# Altium footprint library mmyLibrary.PcbLib: 231 footprints (part 8 of 15)
Each footprint in its own frame and in the unit in brackets; x right, y up, seen from the top. Pads: shape width x height; smd on the part's side, far side on the other; paste and mask are expansions set on the pad; w line width, h text height; cw(c..) or ccw(c..) is an arc to the next point about the centre after c.
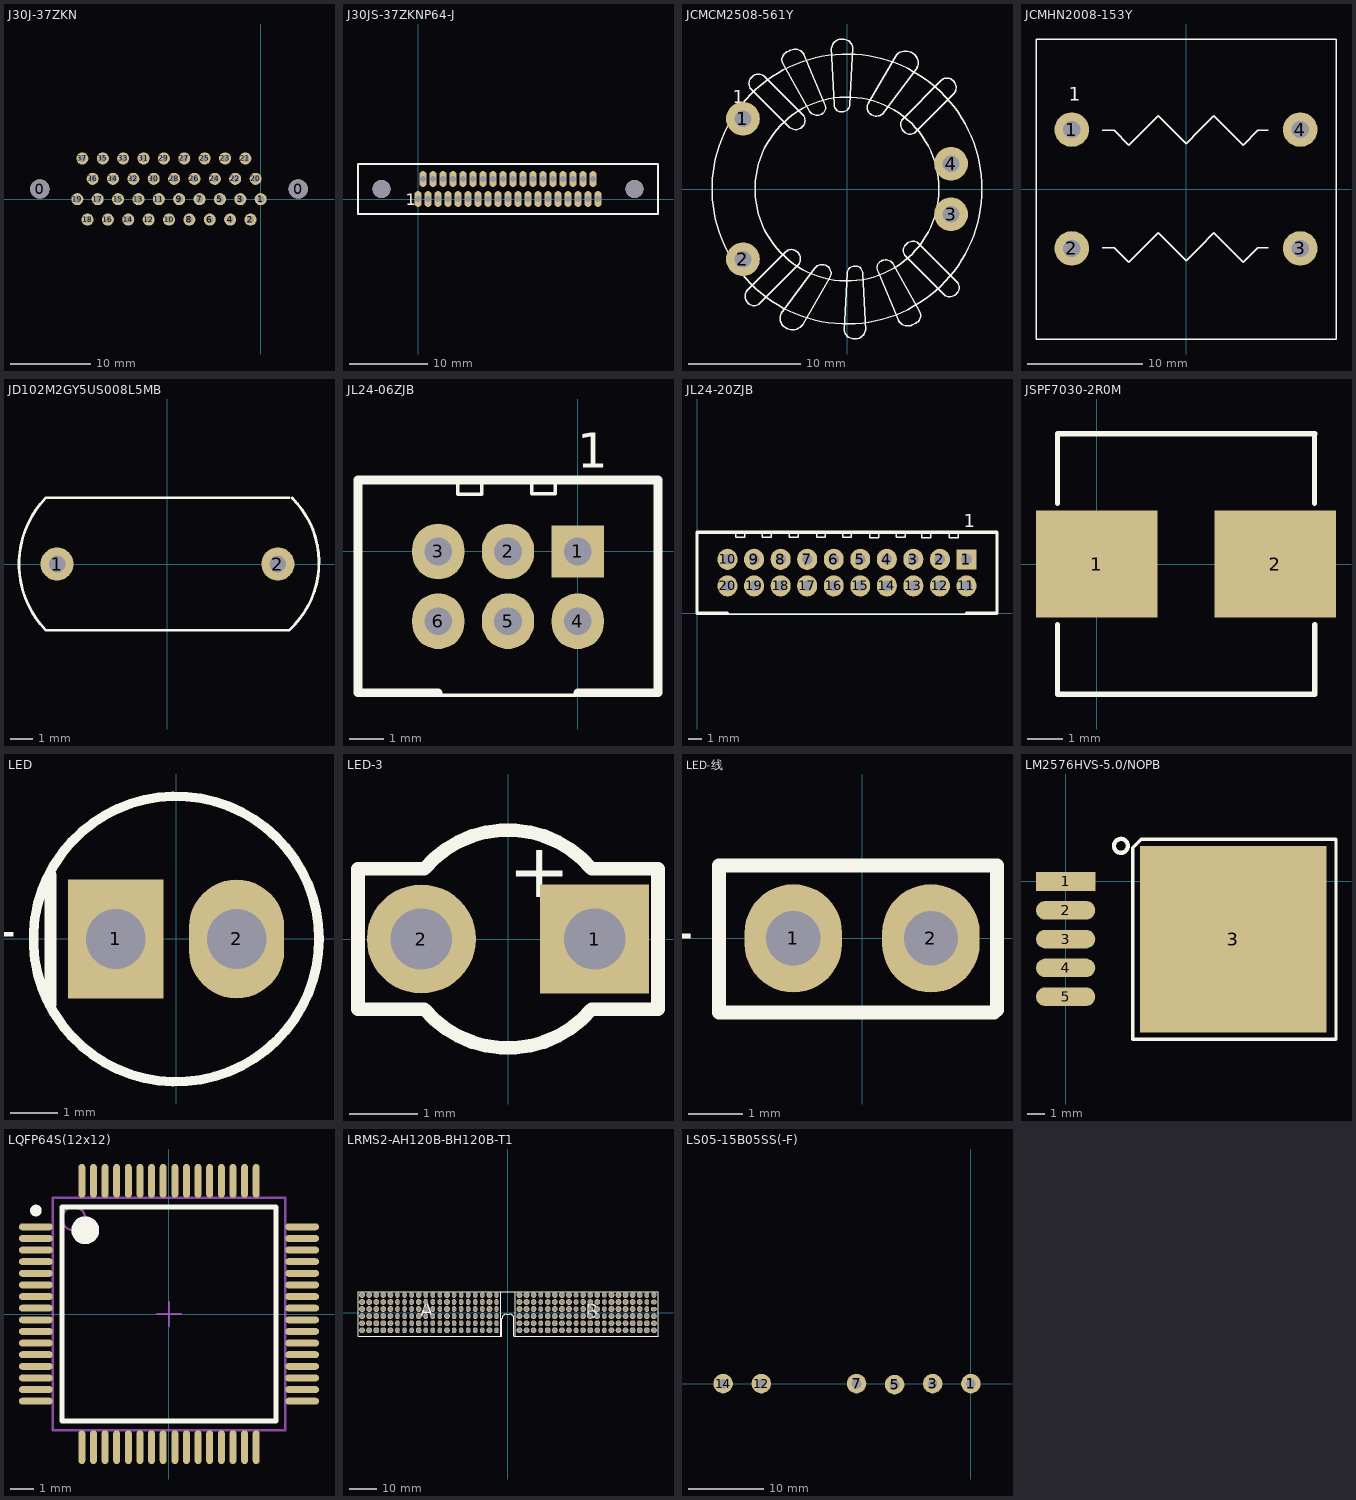
[diagram p7: the footprints below, top view; thin cyan lines are the x and y axes]

## J30J-37ZKN [mm]
pads (39):
  round 2.4 hole 2.4: 0(-27.53,1.27) 0(4.67,1.27)
  round 1.5 hole 0.9: 1(0,0) 2(-1.27,-2.54) 3(-2.54,0) 4(-3.81,-2.54) 5(-5.08,0) 6(-6.35,-2.54) 7(-7.62,0) 8(-8.89,-2.54) 9(-10.16,0) 10(-11.43,-2.54) 11(-12.7,0) 12(-13.97,-2.54) 13(-15.24,0) 14(-16.51,-2.54) 15(-17.78,0) 16(-19.05,-2.54) 17(-20.32,0) 18(-21.59,-2.54) 19(-22.86,0) 20(-0.635,2.54) 21(-1.905,5.08) 22(-3.175,2.54) 23(-4.445,5.08) 24(-5.715,2.54) 25(-6.985,5.08) 26(-8.255,2.54) 27(-9.525,5.08) 28(-10.795,2.54) 29(-12.065,5.08) 30(-13.335,2.54) 31(-14.605,5.08) 32(-15.875,2.54) 33(-17.145,5.08) 34(-18.415,2.54) 35(-19.685,5.08) 36(-20.955,2.54) 37(-22.225,5.08)
Bottom Overlay:
  lines w0.254: -30.03,1.27 cw(c-27.53,1.27) -30.03,1.224 ; 2.17,1.285 ccw(c4.67,1.27) 2.17,1.315 ; -30.13,-3.23 -30.13,5.77 7.27,5.77 7.27,-3.23 -30.13,-3.23

## J30JS-37ZKNP64-J [mm]
pads (37):
  oval 0.9x2 hole 0.7: 1(0,0) 2(1.27,0) 3(2.54,0) 4(3.81,0) 5(5.08,0) 6(6.35,0) 7(7.62,0) 8(8.89,0) 9(10.16,0) 10(11.43,0) 11(12.7,0) 12(13.97,0) 13(15.24,0) 14(16.51,0) 15(17.78,0) 16(19.05,0) 17(20.32,0) 18(21.59,0) 19(22.86,0) 20(0.635,2.54) 21(1.905,2.54) 22(3.175,2.54) 23(4.445,2.54) 24(5.715,2.54) 25(6.985,2.54) 26(8.255,2.54) 28(10.795,2.54) 29(12.065,2.54) 30(13.335,2.54) 31(14.605,2.54) 32(15.875,2.54) 33(17.145,2.54) 34(18.415,2.54) 35(19.685,2.54) 36(20.955,2.54) 37(22.225,2.54)
  oval 0.9x2 hole 0.8: 27(9.525,2.54)
via -4.635,1.27 diameter 2.3 hole 2.3
via 27.495,1.27 diameter 2.3 hole 2.3
Top Overlay:
  lines w0.254: -7.62,-1.905 -7.62,4.445 30.48,4.445 30.48,-1.905 -7.62,-1.905
  text "1" at -1.555,-0.8 h1.5

## JCMCM2508-561Y [mm]
pads (4):
  round 3 hole 1.5: 1(-9.25,6.25) 2(-9.25,-6.25) 3(9.25,-2.25) 4(9.25,2.25)
Top Overlay:
  circle w0.127: c0,0 r8.176
  circle w0.127: c0,0 r12
  lines w0.127: -8.636,9.017 -5.08,5.461 ccw(c-4.572,6.096) -3.937,5.588 ccw(c-4.445,6.096) -3.937,6.604 -7.366,10.033 ccw(c-7.874,9.398) -8.509,9.906 ccw(c-8.001,9.398) -8.509,8.89 ; -7.874,-10.287 -4.318,-6.731 ccw(c-4.953,-6.223) -4.445,-5.588 ccw(c-4.953,-6.096) -5.461,-5.588 -8.89,-9.017 ccw(c-8.255,-9.525) -8.763,-10.16 ccw(c-8.255,-9.652) -7.747,-10.16 ; -5.862,-11.034 -2.921,-7.112 cw(c-2.222,-7.556) -1.778,-6.858 cw(c-2.159,-7.493) -1.524,-7.874 -3.937,-12.065 cw(c-4.826,-11.43) -5.461,-12.319 cw(c-5.016,-11.493) -5.842,-11.049 ; -5.715,11.176 cw(c-5.016,11.493) -5.218,12.234 ; -5.704,11.182 -3.302,6.858 ccw(c-2.667,7.366) -2.159,6.731 ccw(c-2.54,7.239) -2.032,7.62 -3.847,11.976 ; -5.169,12.264 cw(c-4.635,11.493) -3.81,11.938 ; -1.397,12.446 cw(c-0.445,12.383) -0.381,13.335 cw(c-0.381,12.446) 0.508,12.446 ; -1.397,12.573 -1.143,7.493 ccw(c-0.508,7.493) -0.508,6.858 ccw(c-0.445,7.556) 0.254,7.493 0.508,12.573 ; -0.254,-12.573 0,-7.493 cw(c0.699,-7.556) 0.762,-6.858 cw(c0.762,-7.493) 1.397,-7.493 1.651,-12.573 ; -0.254,-12.446 ccw(c0.635,-12.446) 0.635,-13.335 ccw(c0.699,-12.383) 1.651,-12.446 ; 4.572,-11.684 ccw(c5.397,-11.239) 5.931,-12.01 ; 4.609,-11.722 2.794,-7.366 cw(c3.302,-6.985) 2.921,-6.477 cw(c3.429,-7.112) 4.064,-6.604 6.466,-10.928 ; 5.969,4.953 9.525,8.509 ccw(c8.89,9.017) 9.398,9.652 ccw(c8.89,9.144) 8.382,9.652 4.953,6.223 ccw(c5.588,5.715) 5.08,5.08 ccw(c5.588,5.588) 6.096,5.08 ; 5.98,-11.98 ccw(c5.779,-11.239) 6.477,-10.922 ; 6.223,10.795 ccw(c5.397,11.239) 5.842,12.065 ccw(c5.207,11.176) 4.318,11.811 1.905,7.62 ccw(c2.54,7.239) 2.159,6.604 ccw(c2.603,7.302) 3.302,6.858 6.243,10.78 ; 9.779,-8.255 cw(c9.271,-8.763) 9.779,-9.271 cw(c9.144,-8.763) 8.636,-9.398 5.207,-5.969 cw(c5.715,-5.461) 5.207,-4.953 cw(c5.842,-5.461) 6.35,-4.826 9.906,-8.382
  text "1" at -10.16,7.239 h2

## JCMHN2008-153Y [mm] "株洲宏达/25mm*15mm"
height 15
pads (4):
  round 3 hole 1.5: 1(-9.9,5.15) 2(-9.9,-5.15) 3(9.9,-5.15) 4(9.9,5.15)
Top Overlay:
  lines w0.127: -7.239,-5.08 -6.223,-5.08 -4.953,-6.35 -2.413,-3.81 0,-6.223 1.143,-5.08 2.413,-3.81 4.953,-6.35 6.223,-5.08 7.112,-5.08 ; -7.239,5.08 -6.223,5.08 -4.953,3.81 -2.413,6.35 0,3.937 1.143,5.08 2.413,6.35 4.953,3.81 6.223,5.08 7.112,5.08 ; -13,-13 13,-13 13,13 -13,13 -13,-13
  text "1" at -10.16,7.239 h2

## JD102M2GY5US008L5MB [mm]
height 8
pads (2):
  round 1.5 hole 0.75: 1(-5,0) 2(5,0)
Top Overlay:
  lines w0.127: -5.525,-2.982 cw(c-2.413,0) -5.525,2.982 ; -5.5,-3 5.5,-3 ; -5.5,3 5.5,3 ; 5.52,-2.985 ccw(c2.73,0.064) 5.652,2.985

## JL23-20ZJB [mm]

## JL24-06ZJB [mm]
pads (6):
  rect 1.5x1.5 hole 0.8: 1(0,0)
  oval 1.5x1.6 hole 0.8: 2(-2,0) 3(-4,0) 4(0,-2) 5(-2,-2) 6(-4,-2)
Top Overlay:
  lines w0.1: -4,-4.12 0,-4.12 ; -3.434,2.027 -3.434,1.642 -2.758,1.642 -2.758,2.032 ; -1.325,2.039 -1.325,1.654 -0.649,1.654 -0.649,2.044
  lines w0.254: -4,-4.05 -6.3,-4.05 -6.3,2.05 2.3,2.05 2.3,-4.05 0,-4.05
  text "1" at -0.015,2.4 h1

## JL24-20ZJB [mm] "通茂"
pads (20):
  rect 1.5x1.5 hole 0.8: 1(20.3,4.05)
  oval 1.5x1.6 hole 0.8: 2(18.3,4.05) 3(16.3,4.05) 4(14.3,4.05) 5(12.3,4.05) 6(10.3,4.05) 7(8.3,4.05) 8(6.3,4.05) 9(4.3,4.05) 10(2.3,4.05) 11(20.3,2.05) 12(18.3,2.05) 13(16.3,2.05) 14(14.3,2.05) 15(12.3,2.05) 16(10.3,2.05) 17(8.3,2.05) 18(6.3,2.05) 19(4.3,2.05) 20(2.3,2.05)
Top Overlay:
  lines w0.1: 2.3,-0.07 20.3,-0.07 ; 2.912,6.094 2.912,5.709 3.588,5.709 3.588,6.1 ; 4.926,6.094 4.926,5.709 5.602,5.709 5.602,6.1 ; 6.941,6.083 6.941,5.697 7.617,5.697 7.617,6.088 ; 9.003,6.087 9.003,5.702 9.679,5.702 9.679,6.092 ; 10.962,6.083 10.962,5.698 11.638,5.698 11.638,6.088 ; 12.999,6.083 12.999,5.697 13.675,5.697 13.675,6.088 ; 15.008,6.098 15.008,5.713 15.684,5.713 15.684,6.103 ; 16.94,6.067 16.94,5.682 17.616,5.682 17.616,6.072 ; 18.988,6.076 18.988,5.691 19.664,5.691 19.664,6.082
  lines w0.254: 2.3,0 0,0 0,6.1 22.6,6.1 22.6,0 20.3,0
  text "1" at 20.113,6.472 h1

## JSPF7030-2R0M [mm]
pads (2):
  rect 3.4x3 smd: 1(0,0) 2(4.998,0)
Top Overlay:
  lines w0.15: -1.1,-1.7 -1.1,-3.65 6.1,-3.65 6.1,-1.7 ; -1.1,1.7 -1.1,3.65 6.1,3.65 ; 6.098,1.7 6.098,3.65

## LED [mm]
pads (2):
  rect 2x2.5 hole 1.25: 1(-1.27,0)
  oval 2x2.5 hole 1.25: 2(1.27,0)
Top Overlay:
  circle w0.2: c0,0 r3
  lines w0.254: -2.642,-1.372 -2.642,1.346
  text "+" at -3.302,0.432 h0.8

## LED-3 [mm]
pads (2):
  rect 1.6x1.6 hole 0.9: 1(1.27,0)
  round 1.6 hole 0.9: 2(-1.27,0)
Top Overlay:
  lines w0.2: -2.2,-1.028 -1.226,-1.028 ccw(c0,0) 1.226,-1.028 2.2,-1.028 2.2,1.028 1.226,1.028 ccw(c0,0) -1.226,1.028 -2.2,1.028 -2.2,-1.028
  text "+" at 0,0.61 h0.8

## LED-线 [mm]
pads (2):
  oval 1.8x2 hole 1: 1(-1.27,0) 2(1.27,0)
Top Overlay:
  lines w0.254: 2.438,-1.372 -2.642,-1.372 -2.642,1.346 2.489,1.346 2.489,-1.321
  text "+" at -3.048,0.381 h0.8

## LM2576HVS-5.0/NOPB [mm]
pads (6):
  rect 3.5x1.1 smd: 1(0,0)
  oval 3.5x1.1 smd: 2(0,-1.7) 3(0,-3.4) 4(0,-5.1) 5(0,-6.8)
  rect 11x11 smd: 3(9.9,-3.4)
Top Overlay:
  circle w0.254: c3.262,2.1 r0.412
  lines w0.2: 3.95,-9.3 15.95,-9.3 15.95,2.5 4.45,2.5 3.95,2 3.95,-9.3
Top Solder:
  rectangle: 5.3,-8.8 14.444,1.868

## LQFP64S(12x12) [mm]
pads (64):
  oval 1.45x0.3 smd: 1(-5.725,3.75) 2(-5.725,3.25) 3(-5.725,2.75) 4(-5.725,2.25) 5(-5.725,1.75) 6(-5.725,1.25) 7(-5.725,0.75) 8(-5.725,0.25) 9(-5.725,-0.25) 10(-5.725,-0.75) 11(-5.725,-1.25) 12(-5.725,-1.75) 13(-5.725,-2.25) 14(-5.725,-2.75) 15(-5.725,-3.25) 16(-5.725,-3.75) 33(5.725,-3.75) 34(5.725,-3.25) 35(5.725,-2.75) 36(5.725,-2.25) 37(5.725,-1.75) 38(5.725,-1.25) 39(5.725,-0.75) 40(5.725,-0.25) 41(5.725,0.25) 42(5.725,0.75) 43(5.725,1.25) 44(5.725,1.75) 45(5.725,2.25) 46(5.725,2.75) 47(5.725,3.25) 48(5.725,3.75)
  oval 0.3x1.45 smd: 17(-3.75,-5.725) 18(-3.25,-5.725) 19(-2.75,-5.725) 20(-2.25,-5.725) 21(-1.75,-5.725) 22(-1.25,-5.725) 23(-0.75,-5.725) 24(-0.25,-5.725) 25(0.25,-5.725) 26(0.75,-5.725) 27(1.25,-5.725) 28(1.75,-5.725) 29(2.25,-5.725) 30(2.75,-5.725) 31(3.25,-5.725) 32(3.75,-5.725) 49(3.75,5.725) 50(3.25,5.725) 51(2.75,5.725) 52(2.25,5.725) 53(1.75,5.725) 54(1.25,5.725) 55(0.75,5.725) 56(0.25,5.725) 57(-0.25,5.725) 58(-0.75,5.725) 59(-1.25,5.725) 60(-1.75,5.725) 61(-2.25,5.725) 62(-2.75,5.725) 63(-3.25,5.725) 64(-3.75,5.725)
Top Overlay:
  circle w0.6: c-3.6,3.6 r0.3
  circle w0.25: c-5.725,4.45 r0.125
  lines w0.2: -4.6,-4.6 4.6,-4.6 4.6,4.6 -4.6,4.6 -4.6,-4.6
Mechanical 13:
  circle w0.1: c-4.1,4.1 r0.5
  lines w0.1: -5,-5 5,-5 5,5 -5,5 -5,-5
Mechanical 15:
  lines w0.1: -0.5,0 0.5,0 ; 0,-0.5 0,0.5
3D body: height 1.6, standoff 0.05, extent -5,-5 5,5

## LRMS2-AH120B-BH120B-T1 [mm]
pads (240):
  round 2.1 hole 1.5: 1(-52.38,-6.35) 1(4.12,-6.35) 2(-49.84,-6.35) 2(6.66,-6.35) 3(-47.3,-6.35) 4(-44.76,-6.35) 5(-42.22,-6.35) 5(14.28,-6.35) 6(16.82,-6.35) 7(19.36,-6.35) 8(21.9,-6.35) 9(-32.06,-6.35) 11(29.52,-6.35) 13(-21.9,-6.35) 14(37.14,-6.35) 15(39.68,-6.35) 16(42.22,-6.35) 17(44.76,-6.35) 18(47.3,-6.35) 19(-6.66,-6.35) 19(49.84,-6.35) 20(52.38,-6.35) 21(-52.38,-3.81) 21(4.12,-3.81) 22(-49.84,-3.81) 22(6.66,-3.81) 23(-47.3,-3.81) 24(-44.76,-3.81) 25(-42.22,-3.81) 25(14.28,-3.81) 26(16.82,-3.81) 27(19.36,-3.81) 28(21.9,-3.81) 29(-32.06,-3.81) 31(29.52,-3.81) 33(-21.9,-3.81) 34(37.14,-3.81) 35(39.68,-3.81) 36(42.22,-3.81) 37(44.76,-3.81) 38(47.3,-3.81) 39(-6.66,-3.81) 39(49.84,-3.81) 40(52.38,-3.81) 41(-52.38,-1.27) 41(4.12,-1.27) 42(-49.84,-1.27) 42(6.66,-1.27) 43(-47.3,-1.27) 44(-44.76,-1.27) 45(-42.22,-1.27) 45(14.28,-1.27) 46(16.82,-1.27) 47(19.36,-1.27) 48(21.9,-1.27) 49(-32.06,-1.27) 51(29.52,-1.27) 53(-21.9,-1.27) 54(37.14,-1.27) 55(39.68,-1.27) 56(42.22,-1.27) 57(44.76,-1.27) 58(47.3,-1.27) 59(-6.66,-1.27) 59(49.84,-1.27) 60(52.38,-1.27) 61(-52.38,1.27) 61(4.12,1.27) 62(-49.84,1.27) 62(6.66,1.27) 63(-47.3,1.27) 64(-44.76,1.27) 65(-42.22,1.27) 65(14.28,1.27) 66(16.82,1.27) 67(19.36,1.27) 68(21.9,1.27) 69(-32.06,1.27) 71(29.52,1.27) 73(-21.9,1.27) 74(37.14,1.27) 75(39.68,1.27) 76(42.22,1.27) 77(44.76,1.27) 78(47.3,1.27) 79(-6.66,1.27) 81(-52.38,3.81) 81(4.12,3.81) 82(-49.84,3.81) 82(6.66,3.81) 83(-47.3,3.81) 84(-44.76,3.81) 85(-42.22,3.81) 85(14.28,3.81) 86(16.82,3.81) 87(19.36,3.81) 88(21.9,3.81) 89(-32.06,3.81) 91(29.52,3.81) 93(-21.9,3.81) 94(37.14,3.81) 95(39.68,3.81) 96(42.22,3.81) 97(44.76,3.81) 98(47.3,3.81) 99(-6.66,3.81) 101(-52.38,6.35) 101(4.12,6.35) 102(-49.84,6.35) 102(6.66,6.35) 103(-47.3,6.35) 104(-44.76,6.35) 105(-42.22,6.35) 105(14.28,6.35) 106(16.82,6.35) 107(19.36,6.35) 108(21.9,6.35) 109(-32.06,6.35) 111(29.52,6.35) 113(-21.9,6.35) 114(37.14,6.35) 115(39.68,6.35) 116(42.22,6.35) 117(44.76,6.35) 118(47.3,6.35) 119(-6.66,6.35)
  oval 2x2.1 hole 1.5: 3(9.2,-6.35) 10(26.98,-6.35) 12(32.06,-6.35) 23(9.2,-3.81) 30(26.98,-3.81) 32(32.06,-3.81) 43(9.2,-1.27) 50(26.98,-1.27) 52(32.06,-1.27) 63(9.2,1.27) 70(26.98,1.27) 72(32.06,1.27) 83(9.2,3.81) 90(26.98,3.81) 92(32.06,3.81) 103(9.2,6.35) 110(26.98,6.35) 112(32.06,6.35)
  oval 1.7x2 hole 1.4: 4(11.74,-6.35) 9(24.44,-6.35) 13(34.6,-6.35) 24(11.74,-3.81) 29(24.44,-3.81) 33(34.6,-3.81) 44(11.74,-1.27) 49(24.44,-1.27) 53(34.6,-1.27) 64(11.74,1.27) 73(34.6,1.27) 84(11.74,3.81) 89(24.44,3.81) 93(34.6,3.81) 99(49.84,3.81) 104(11.74,6.35) 109(24.44,6.35) 113(34.6,6.35)
  oval 1.6x2.1 hole 1.5: 6(-39.68,-6.35) 7(-37.14,-6.35) 8(-34.6,-6.35) 10(-29.52,-6.35) 11(-26.98,-6.35) 12(-24.44,-6.35) 14(-19.36,-6.35) 15(-16.82,-6.35) 16(-14.28,-6.35) 17(-11.74,-6.35) 18(-9.2,-6.35) 20(-4.12,-6.35) 26(-39.68,-3.81) 27(-37.14,-3.81) 28(-34.6,-3.81) 30(-29.52,-3.81) 31(-26.98,-3.81) 32(-24.44,-3.81) 34(-19.36,-3.81) 35(-16.82,-3.81) 36(-14.28,-3.81) 37(-11.74,-3.81) 38(-9.2,-3.81) 40(-4.12,-3.81) 46(-39.68,-1.27) 47(-37.14,-1.27) 48(-34.6,-1.27) 50(-29.52,-1.27) 51(-26.98,-1.27) 52(-24.44,-1.27) 54(-19.36,-1.27) 55(-16.82,-1.27) 56(-14.28,-1.27) 57(-11.74,-1.27) 58(-9.2,-1.27) 60(-4.12,-1.27) 66(-39.68,1.27) 67(-37.14,1.27) 68(-34.6,1.27) 70(-29.52,1.27) 71(-26.98,1.27) 72(-24.44,1.27) 74(-19.36,1.27) 75(-16.82,1.27) 76(-14.28,1.27) 77(-11.74,1.27) 78(-9.2,1.27) 80(-4.12,1.27) 86(-39.68,3.81) 87(-37.14,3.81) 88(-34.6,3.81) 90(-29.52,3.81) 91(-26.98,3.81) 92(-24.44,3.81) 94(-19.36,3.81) 95(-16.82,3.81) 96(-14.28,3.81) 97(-11.74,3.81) 98(-9.2,3.81) 100(-4.12,3.81) 106(-39.68,6.35) 107(-37.14,6.35) 108(-34.6,6.35) 110(-29.52,6.35) 111(-26.98,6.35) 112(-24.44,6.35) 114(-19.36,6.35) 115(-16.82,6.35) 116(-14.28,6.35) 118(-9.2,6.35) 119(49.84,6.35) 120(-4.12,6.35)
  oval 1.7x2 hole 1.44: 69(24.44,1.27)
  oval 1.5x2.1 hole 1.5: 79(49.84,1.27)
  oval 2.1x1.6 hole 1.5: 80(52.38,1.27)
  oval 2.1x1.8 hole 1.5: 100(52.38,3.81)
  oval 1.6x2.1 hole 1.6: 117(-11.74,6.35)
  oval 1.8x2.1 hole 1.5: 120(52.38,6.35)
Top Overlay:
  lines w0.1: -2.534,-8.55 -2.534,7.55 ; -2.15,-2.156 cw(c-0.544,-2.156) -0.544,-0.55 0.544,-0.55 cw(c0.544,-2.156) 2.15,-2.156 ; -2.15,-2.12 -2.15,-8.55 -53.842,-8.55 -53.842,7.55 53.854,7.55 53.854,-8.55 2.162,-8.55 ; 2.15,-8.55 2.15,-2.12 ; 2.546,-8.55 2.546,7.55
  text "A" at -31.49,-1.438 h5
  text "B" at 27.946,-1.946 h5

## LS05-15B05SS(-F) [mm]
pads (6):
  round 2.6 hole 1.3: 1(0,0) 3(-5.08,0) 5(-10.16,-0.127) 7(-15.24,0) 12(-27.94,0) 14(-33.02,0)
Bottom Overlay:
  circle w0.5: c-0.036,2.794 r0.284
  lines w0.254: -36.51,1.138 -36.51,18.674 -35.184,20 2.413,20 3.49,18.923 3.49,1.016 2.474,0 -35.372,0 -36.51,1.138
  text "14" at -32.07,2.54 h2
  text "12" at -27.117,2.54 h2
  text "7" at -14.798,2.54 h2
  text "5" at -9.845,2.54 h2
  text "3" at -4.765,2.54 h2
  text "LS05-15B05SS" at -7.112,11.43 h3